# Altium footprint library LukaLIBRARY.PcbLib: 784 footprints (part 35 of 49)
Each footprint in its own frame and in the unit in brackets; x right, y up, seen from the top. Pads: shape width x height; smd on the part's side, far side on the other; paste and mask are expansions set on the pad; w line width, h text height; cw(c..) or ccw(c..) is an arc to the next point about the centre after c.
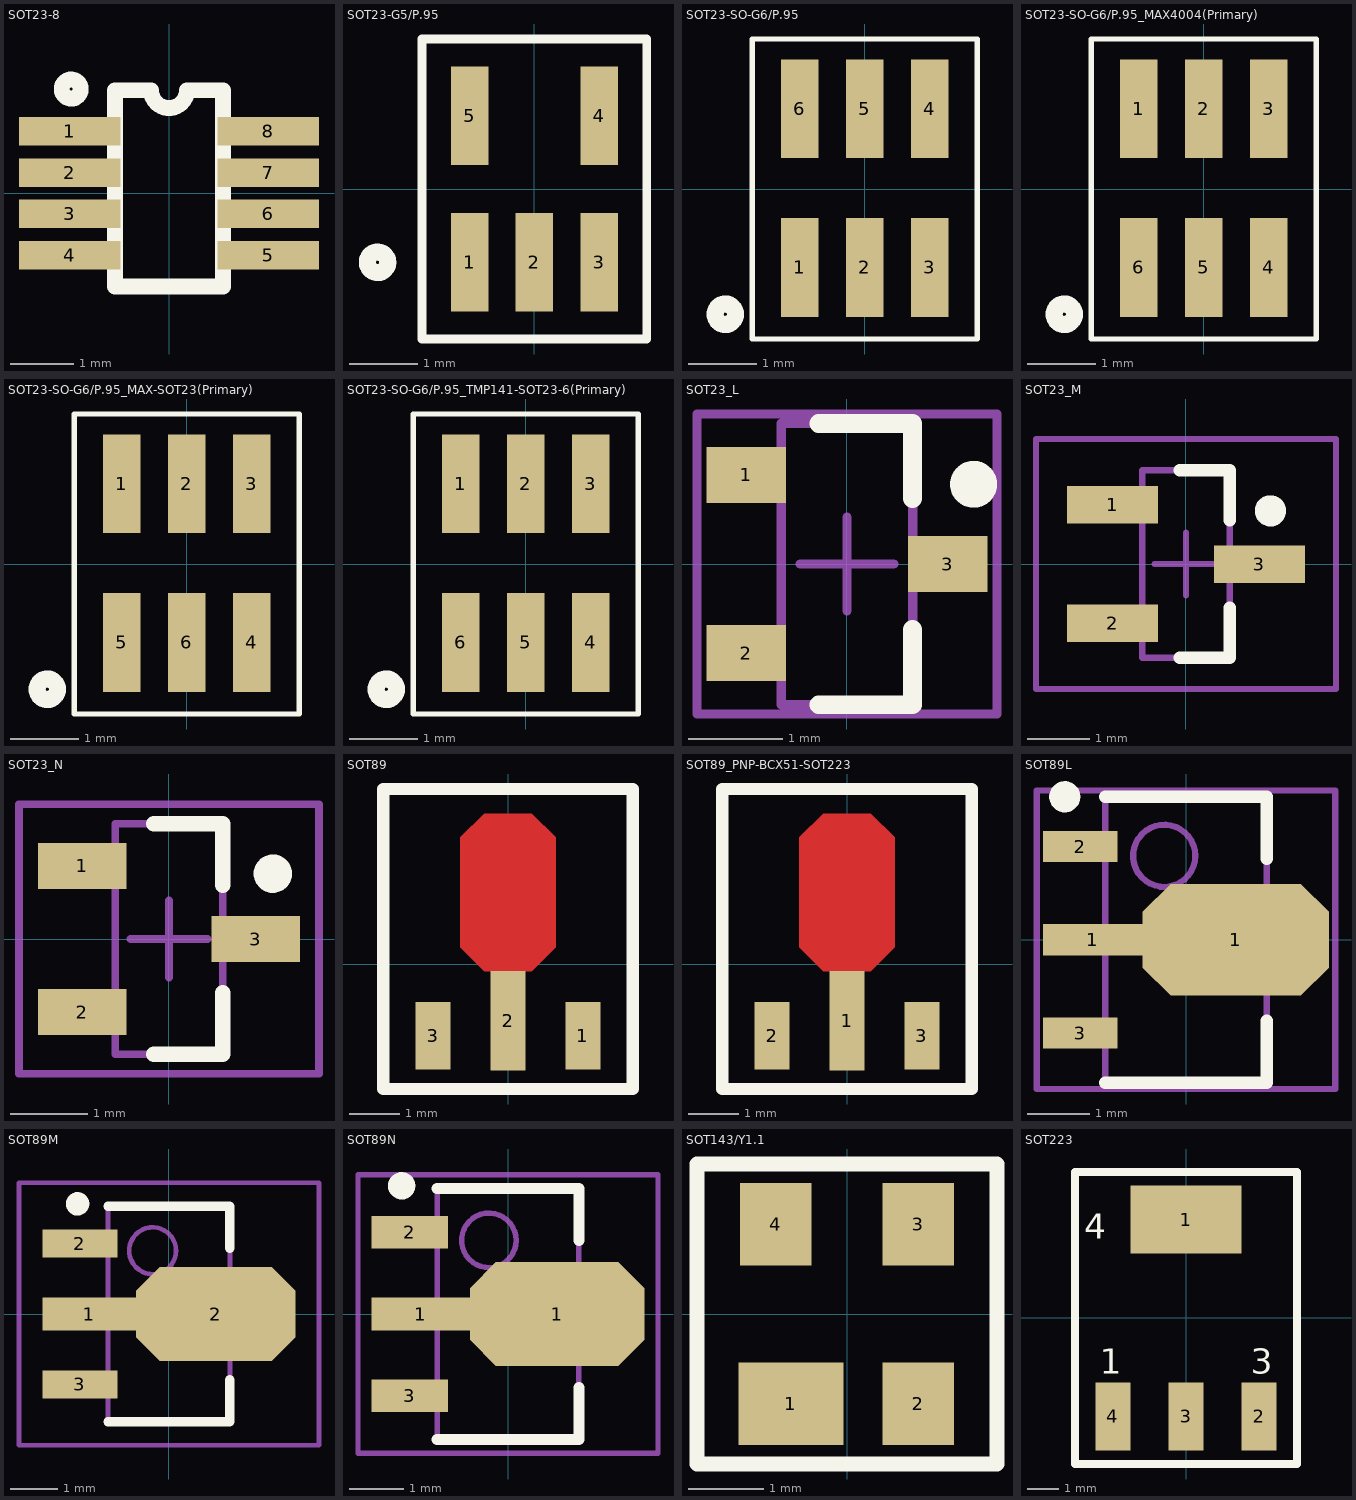
[diagram p34: the footprints below, top view; thin cyan lines are the x and y axes]

## SOT23-8 [mm]
pads (8):
  rect 1.6x0.45 smd: 1(-1.567,0.975) 2(-1.567,0.325) 3(-1.567,-0.325) 4(-1.567,-0.975) 5(1.567,-0.975) 6(1.567,-0.325) 7(1.567,0.325) 8(1.567,0.975)
Top Overlay:
  circle w0.25: c-1.542,1.644 r0.15
  lines w0.25: -0.85,-1.474 0.85,-1.474 0.85,1.626 0.283,1.626 cw(c0,1.626) -0.283,1.626 -0.85,1.626 -0.85,-1.474

## SOT23-G5/P.95 [mm]
pads (5):
  rect 0.55x1.45 smd mask-25.4: 1(-0.95,-1.075) 2(0,-1.075) 3(0.95,-1.075) 4(0.95,1.075) 5(-0.95,1.075)
Top Overlay:
  circle w0.25: c-2.3,-1.075 r0.15
  lines w0.127: -1.65,-2.2 -1.65,2.2 1.65,2.2 1.65,-2.2 -1.65,-2.2
Top Solder:
  region: -1.225,0.35 -0.675,0.35 -0.675,1.8 -1.225,1.8
  region: 0.675,0.35 1.225,0.35 1.225,1.8 0.675,1.8
  region: 0.675,-1.8 1.225,-1.8 1.225,-0.35 0.675,-0.35
  region: -0.275,-1.8 0.275,-1.8 0.275,-0.35 -0.275,-0.35
  region: -1.225,-1.8 -0.675,-1.8 -0.675,-0.35 -1.225,-0.35

## SOT23-SO-G6/P.95 [mm]
pads (6):
  rect 0.55x1.45 smd: 1(-0.95,-1.151) 2(0,-1.151) 3(0.95,-1.151) 4(0.95,1.177) 5(0,1.177) 6(-0.95,1.177)
Top Overlay:
  circle w0.25: c-2.046,-1.837 r0.15
  lines w0.076: -1.65,-2.2 1.65,-2.2 1.65,2.2 -1.65,2.2 -1.65,-2.2

## SOT23-SO-G6/P.95_MAX4004(Primary) [mm]
pads (6):
  rect 0.55x1.45 smd: 1(-0.95,1.177) 2(0,1.177) 3(0.95,1.177) 4(0.95,-1.151) 5(0,-1.151) 6(-0.95,-1.151)
Top Overlay:
  circle w0.25: c-2.046,-1.837 r0.15
  lines w0.076: -1.65,-2.2 -1.65,2.2 1.65,2.2 1.65,-2.2 -1.65,-2.2

## SOT23-SO-G6/P.95_MAX-SOT23(Primary) [mm]
pads (6):
  rect 0.55x1.45 smd: 1(-0.95,1.177) 2(0,1.177) 3(0.95,1.177) 4(0.95,-1.151) 5(-0.95,-1.151) 6(0,-1.151)
Top Overlay:
  circle w0.25: c-2.046,-1.837 r0.15
  lines w0.076: -1.65,-2.2 1.65,-2.2 1.65,2.2 -1.65,2.2 -1.65,-2.2

## SOT23-SO-G6/P.95_TMP141-SOT23-6(Primary) [mm]
pads (6):
  rect 0.55x1.45 smd: 1(-0.95,1.177) 2(0,1.177) 3(0.95,1.177) 4(0.95,-1.151) 5(0,-1.151) 6(-0.95,-1.151)
Top Overlay:
  circle w0.25: c-2.046,-1.837 r0.15
  lines w0.076: -1.65,-2.2 1.65,-2.2 1.65,2.2 -1.65,2.2 -1.65,-2.2

## SOT23_L [mm] "SOT23, 3-Leads, Body 2.9x1.3mm, Pitch 0.95mm, Lead Span 2.3mm - Reverse Pinning, IPC High Density"
height 1.1
pads (3):
  rect 0.85x0.6 smd: 1(-1.075,0.95) 2(-1.075,-0.95) 3(1.075,0)
Top Overlay:
  circle w0.25: c1.35,0.85 r0.125
  lines w0.2: -0.3,-1.5 0.7,-1.5 0.7,-0.7 ; -0.3,1.5 0.7,1.5 0.7,0.7
Mechanical 13:
  lines w0.1: -0.7,-1.5 0.7,-1.5 0.7,1.5 -0.7,1.5 -0.7,-1.5
Mechanical 15:
  lines w0.1: -0.5,0 0.5,0 ; 0,-0.5 0,0.5 ; -1.6,-1.6 1.6,-1.6 1.6,1.6 -1.6,1.6 -1.6,-1.6
3D body: height 1.1, standoff 0, extent -0.7,-1.5 0.7,1.5

## SOT23_M [mm] "SOT23, 3-Leads, Body 2.9x1.3mm, Pitch 0.95mm, Lead Span 2.3mm - Reverse Pinning, IPC Low Density"
height 1.1
pads (3):
  rect 1.45x0.6 smd: 1(-1.175,0.95) 2(-1.175,-0.95) 3(1.175,0)
Top Overlay:
  circle w0.25: c1.35,0.85 r0.125
  lines w0.2: -0.1,-1.5 0.7,-1.5 0.7,-0.7 ; -0.1,1.5 0.7,1.5 0.7,0.7
Mechanical 13:
  lines w0.1: -0.7,-1.5 0.7,-1.5 0.7,1.5 -0.7,1.5 -0.7,-1.5
Mechanical 15:
  lines w0.1: -0.5,0 0.5,0 ; 0,-0.5 0,0.5 ; -2.4,-2 2.4,-2 2.4,2 -2.4,2 -2.4,-2
3D body: height 1.1, standoff 0, extent -0.7,-1.5 0.7,1.5

## SOT23_N [mm] "SOT23, 3-Leads, Body 2.9x1.3mm, Pitch 0.95mm, Lead Span 2.3mm - Reverse Pinning, IPC Medium Density"
height 1.1
pads (3):
  rect 1.15x0.6 smd: 1(-1.125,0.95) 2(-1.125,-0.95) 3(1.125,0)
Top Overlay:
  circle w0.25: c1.35,0.85 r0.125
  lines w0.2: -0.2,-1.5 0.7,-1.5 0.7,-0.7 ; -0.2,1.5 0.7,1.5 0.7,0.7
Mechanical 13:
  lines w0.1: -0.7,-1.5 -0.7,1.5 0.7,1.5 0.7,-1.5 -0.7,-1.5
Mechanical 15:
  lines w0.1: -0.5,0 0.5,0 ; 0,-0.5 0,0.5 ; -1.95,-1.75 -1.95,1.75 1.95,1.75 1.95,-1.75 -1.95,-1.75
3D body: height 1.1, standoff 0, extent -0.7,-1.5 0.7,1.5

## SOT89 [mm]
pads (4):
  rect 0.7x1.35 smd: 1(1.5,-1.432) 3(-1.5,-1.432)
  rect 0.7x1.99 smd: 2(0,-1.138)
  round 0 smd paste-25.4 mask-25.4: 4(0,1.433)
Top Layer:
  region: 0.475,3.008 0.95,2.533 0.95,0.333 0.475,-0.142 -0.475,-0.142 -0.95,0.333 -0.95,2.533 -0.475,3.008
Top Overlay:
  lines w0.25: -2.5,-2.5 2.5,-2.5 2.5,3.5 -2.5,3.5 -2.5,-2.5
Top Paste:
  region: 0.475,3.008 0.95,2.533 0.95,0.333 0.475,-0.142 -0.475,-0.142 -0.95,0.333 -0.95,2.533 -0.475,3.008
Top Solder:
  region: 0.553,3.085 1.028,2.61 1.06,2.533 1.06,0.333 1.028,0.255 0.553,-0.22 0.475,-0.252 -0.475,-0.252 -0.553,-0.22 -1.028,0.255 -1.06,0.333 -1.06,2.533 -1.028,2.61 -0.553,3.085 -0.475,3.117 0.475,3.117

## SOT89_PNP-BCX51-SOT223 [mm]
pads (4):
  rect 0.7x1.99 smd: 1(0,-1.138)
  rect 0.7x1.35 smd: 2(-1.5,-1.432) 3(1.5,-1.432)
  round 0 smd paste-25.4 mask-25.4: 4(0,1.433)
Top Layer:
  region: 0.475,3.008 0.95,2.533 0.95,0.333 0.475,-0.142 -0.475,-0.142 -0.95,0.333 -0.95,2.533 -0.475,3.008
Top Overlay:
  lines w0.25: -2.5,-2.5 -2.5,3.5 2.5,3.5 2.5,-2.5 -2.5,-2.5
Top Paste:
  region: 0.475,3.008 0.95,2.533 0.95,0.333 0.475,-0.142 -0.475,-0.142 -0.95,0.333 -0.95,2.533 -0.475,3.008
Top Solder:
  region: 0.553,3.085 1.028,2.61 1.06,2.533 1.06,0.333 1.028,0.255 0.553,-0.22 0.475,-0.252 -0.475,-0.252 -0.553,-0.22 -1.028,0.255 -1.06,0.333 -1.06,2.533 -1.028,2.61 -0.553,3.085 -0.475,3.117 0.475,3.117

## SOT89L [mm] "SOT89, 3-Leads, Body 4.5x2.4 mm, Pitch 1.5mm, Lead Span 4.1mm, IPC High Density"
height 1.6
pads (4):
  rect 1.6x0.5 smd: 1(-1.5,0)
  oct 3x1.8 smd: 1(0.8,0)
  rect 1.2x0.5 smd: 2(-1.7,1.5) 3(-1.7,-1.5)
Top Overlay:
  circle w0.25: c-1.95,2.3 r0.125
  lines w0.2: -1.3,-2.3 1.3,-2.3 1.3,-1.3 ; -1.3,2.3 1.3,2.3 1.3,1.3
Mechanical 13:
  circle w0.1: c-0.35,1.35 r0.5
  lines w0.1: -1.3,-2.3 1.3,-2.3 1.3,2.3 -1.3,2.3 -1.3,-2.3
Mechanical 15:
  lines w0.1: -0.5,0 0.5,0 ; 0,-0.5 0,0.5 ; -2.4,-2.4 2.4,-2.4 2.4,2.4 -2.4,2.4 -2.4,-2.4
3D body: height 1.6, standoff 0, extent -1.3,-2.3 1.3,2.3

## SOT89M [mm] "SOT89, 3-Leads, Body 4.5x2.4 mm, Pitch 1.5mm, Lead Span 4.1mm, IPC Low Density"
height 1.6
pads (4):
  rect 2x0.7 smd: 1(-1.7,0)
  rect 1.6x0.6 smd: 2(-1.9,1.5) 3(-1.9,-1.5)
  oct 3.4x2 smd: 2(1,0)
Top Overlay:
  circle w0.25: c-1.95,2.35 r0.125
  lines w0.2: -1.3,-2.3 1.3,-2.3 1.3,-1.4 ; -1.3,2.3 1.3,2.3 1.3,1.4
Mechanical 13:
  circle w0.1: c-0.35,1.35 r0.5
  lines w0.1: -1.3,-2.3 -1.3,2.3 1.3,2.3 1.3,-2.3 -1.3,-2.3
Mechanical 15:
  lines w0.1: -0.5,0 0.5,0 ; 0,-0.5 0,0.5 ; -3.2,-2.8 -3.2,2.8 3.2,2.8 3.2,-2.8 -3.2,-2.8
3D body: height 1.6, standoff 0, extent -1.3,-2.3 1.3,2.3

## SOT89N [mm] "SOT89, 3-Leads, Body 4.5x2.4 mm, Pitch 1.5mm, Lead Span 4.1mm, IPC Medium Density"
height 1.6
pads (4):
  rect 1.8x0.6 smd: 1(-1.6,0)
  oct 3.2x1.9 smd: 1(0.9,0)
  rect 1.4x0.6 smd: 2(-1.8,1.5) 3(-1.8,-1.5)
Top Overlay:
  circle w0.25: c-1.95,2.35 r0.125
  lines w0.2: -1.3,-2.3 1.3,-2.3 1.3,-1.35 ; -1.3,2.3 1.3,2.3 1.3,1.35
Mechanical 13:
  circle w0.1: c-0.35,1.35 r0.5
  lines w0.1: -1.3,-2.3 -1.3,2.3 1.3,2.3 1.3,-2.3 -1.3,-2.3
Mechanical 15:
  lines w0.1: -0.5,0 0.5,0 ; 0,-0.5 0,0.5 ; -2.75,-2.55 -2.75,2.55 2.75,2.55 2.75,-2.55 -2.75,-2.55
3D body: height 1.6, standoff 0, extent -1.3,-2.3 1.3,2.3

## SOT143/Y1.1 [mm]
pads (4):
  rect 1.4x1.1 smd: 1(-0.75,-1.2)
  rect 0.95x1.1 smd: 2(0.95,-1.2) 3(0.95,1.2) 4(-0.95,1.2)
Top Overlay:
  lines w0.2: -2,-2 -2,2 2,2 2,-2 -2,-2

## SOT223 [mm]
pads (4):
  rect 3.5x2.15 smd: 1(0,3.1)
  rect 1.1x2.15 smd: 2(2.3,-3.1) 3(0,-3.1) 4(-2.3,-3.1)
Top Overlay:
  lines w0.25: -3.5,-4.6 -3.5,4.6 3.5,4.6 3.5,-4.6 -3.5,-4.6
  text "1" at -2.71,-1.75 h0.79
  text "4" at -3.21,2.5 h0.79
  text "3" at 2.04,-1.75 h0.79